# Altium footprint library OT Library.PcbLib: 396 footprints (part 14 of 25)
Each footprint in its own frame and in the unit in brackets; x right, y up, seen from the top. Pads: shape width x height; smd on the part's side, far side on the other; paste and mask are expansions set on the pad; w line width, h text height; cw(c..) or ccw(c..) is an arc to the next point about the centre after c.
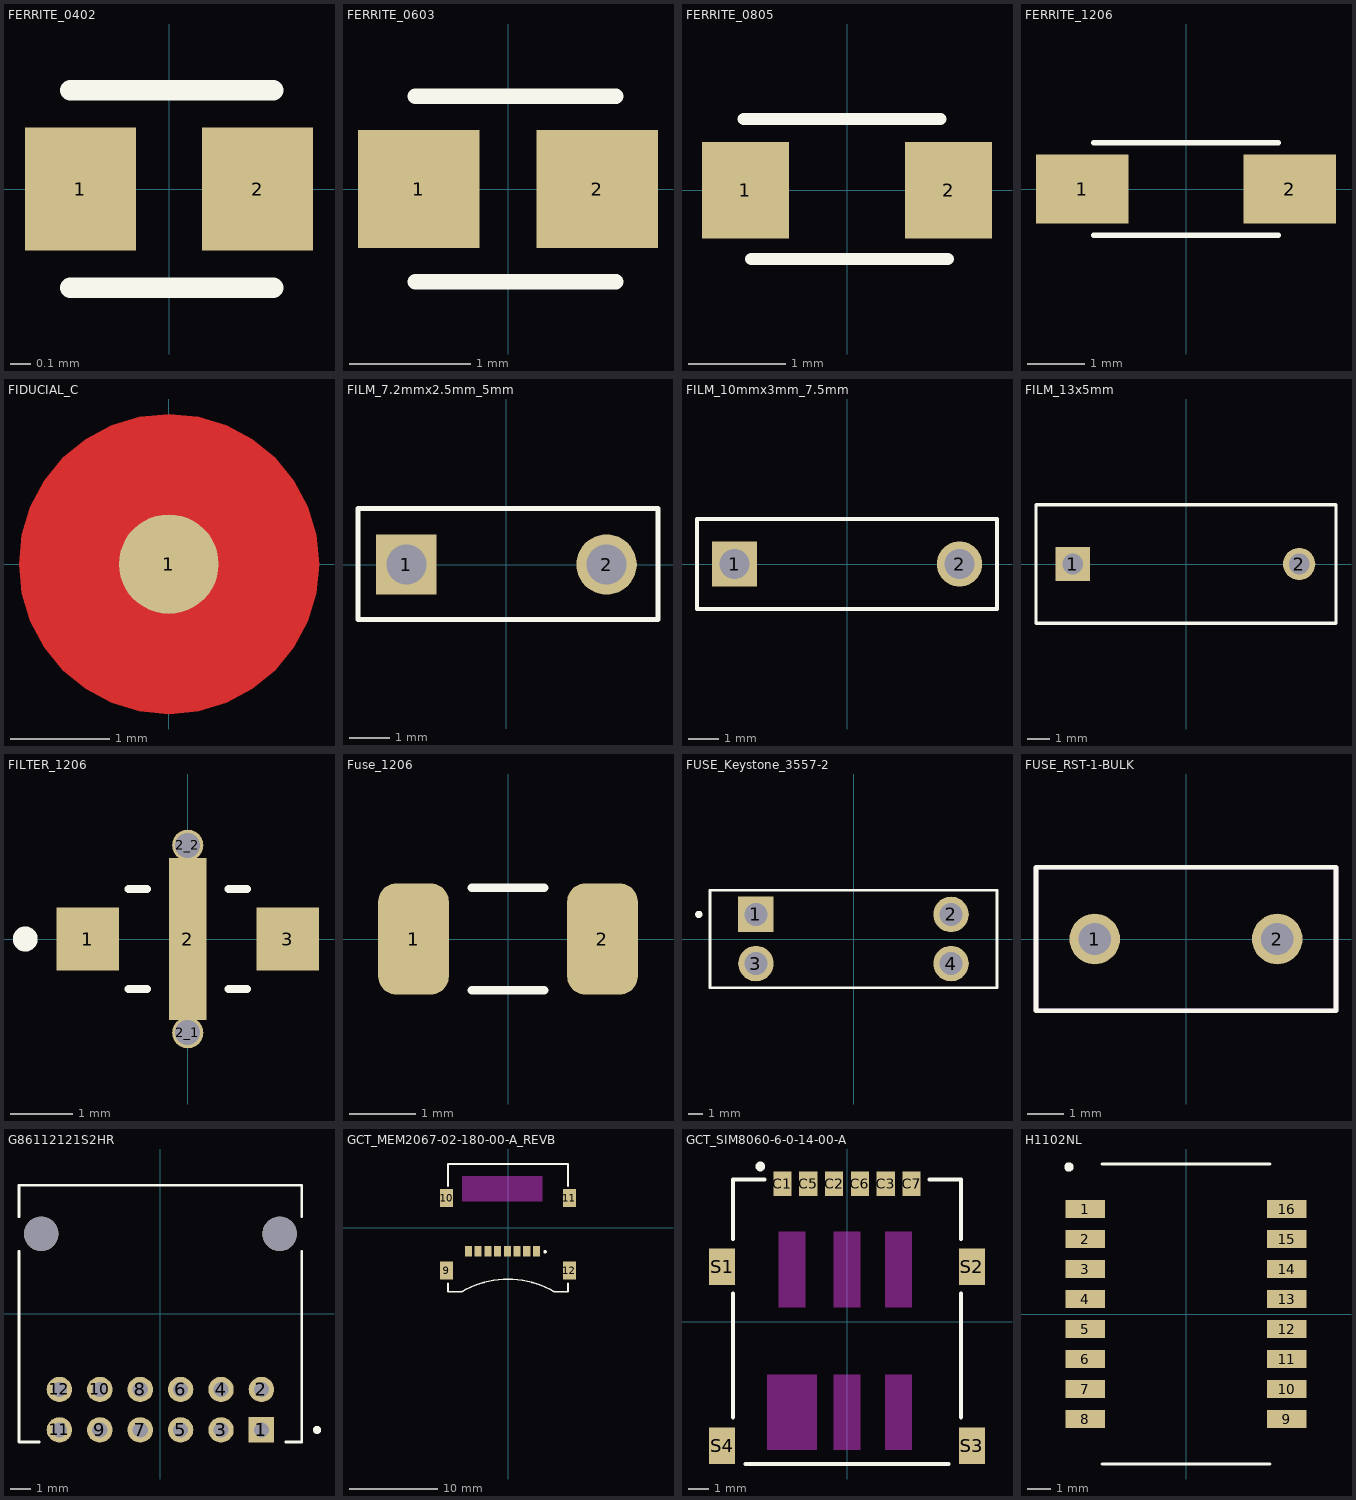
[diagram p13: the footprints below, top view; thin cyan lines are the x and y axes]

## FERRITE_0402 [mm] "0.039\" L x 0.022\" W (1.00mm x 0.55mm)"
height 0.55
pads (2):
  rect 0.54x0.6 smd: 1(-0.432,0) 2(0.432,0)
Top Overlay:
  lines w0.1: -0.483,-0.483 0.508,-0.483 ; -0.483,0.483 0.508,0.483
3D body: height 0.48, standoff -0.02, extent -0.5,-0.279 0.5,0.271

## FERRITE_0603 [mm] "0.063\" L x 0.032\" W (1.60mm x 0.80mm)"
height 0.95
pads (2):
  rect 1x0.97 smd: 1(-0.735,0) 2(0.735,0)
Top Overlay:
  lines w0.127: -0.762,-0.762 0.889,-0.762 ; -0.762,0.762 0.889,0.762
3D body: height 0.8, standoff 0, extent -0.8,-0.48 0.8,0.47

## FERRITE_0805 [mm] "SMD EMI Suppression Ferrite Bead, 2-Leads, body 2.00x1.20mm"
height 1.1
pads (2):
  rect 0.9x1 smd: 1(-1.05,0) 2(1.05,0)
Top Overlay:
  lines w0.127: -1.067,0.737 0.965,0.737 ; -0.991,-0.711 1.041,-0.711
3D body: height 0.9, standoff 0, extent -1,-0.6 1,0.6

## FERRITE_1206 [mm] "SMD EMI Suppression Ferrite  Bead, body 3.20x1.60mm"
height 1.3
pads (2):
  rect 1.6x1.2 smd: 1(-1.8,0) 2(1.8,0)
Top Overlay:
  lines w0.1: -1.6,-0.8 1.6,-0.8 ; -1.6,0.8 1.6,0.8
3D body: height 1.1, standoff 0, extent -1.6,-0.8 1.6,0.8

## FIDUCIAL_C [mm]
pads (1):
  rrect100% 1x1 smd: 1(0,0)
Top Layer:
  pour cut-out: 0.002,-1.506 -0.292,-1.477 -0.574,-1.392 -0.835,-1.252 -1.063,-1.065 -1.251,-0.836 -1.39,-0.576 -1.476,-0.293 -1.505,0.001 -1.476,0.295 -1.39,0.578 -1.251,0.838 -1.063,1.067 -0.835,1.254 -0.574,1.394 -0.292,1.479 0.002,1.508 0.296,1.479 0.579,1.394 0.84,1.254 1.068,1.067 1.256,0.838 1.395,0.578 1.481,0.295 1.51,0.001 1.481,-0.293 1.395,-0.576 1.256,-0.836 1.068,-1.065 0.84,-1.252 0.579,-1.392 0.296,-1.477
Top Solder:
  circle w1.5: c0,0 r0.75

## FILM_7.2mmx2.5mm_5mm [mm]
height 8
pads (2):
  rect 1.508x1.508 / inner round 1.508 / far side rect 1.508x1.508 hole 1: 1(-2.5,0)
  round 1.508 hole 1: 2(2.5,0)
Top Overlay:
  lines w0.127: -3.707,-1.372 3.785,-1.372 3.785,1.397 -3.707,1.397 -3.707,-1.372
3D body: height 6.6, standoff -5.5, extent -3.7,-1.295 3.7,1.31

## FILM_10mmx3mm_7.5mm [mm]
height 8
pads (2):
  rect 1.508x1.508 / inner round 1.508 / far side rect 1.508x1.508 hole 1: 1(-3.75,0)
  round 1.508 hole 1: 2(3.75,0)
Top Overlay:
  lines w0.127: -5,-1.5 -5,1.5 5,1.5 5,-1.5 -5,-1.5
3D body: height 8.1, standoff -6, extent -5.1,-1.524 5.1,1.581

## FILM_13x5mm [mil] "Height 0.437\" (11.10mm)"
height 158
pads (2):
  rect 60x60 hole 36 mask-1000: 1(-196.85,0)
  round 56 hole 36 mask-1000: 2(196.85,0)
Top Overlay:
  lines w6: -260.9,-103.42 -260.9,103.42 260.9,103.42 260.9,-103.42 -260.9,-103.42
Top Solder:
  region: 196.85,-28.24 204.16,-27.28 210.97,-24.46 216.82,-19.97 221.31,-14.12 224.13,-7.31 225.09,0 224.13,7.31 221.31,14.12 216.82,19.97 210.97,24.46 204.16,27.28 196.85,28.24 189.54,27.28 182.73,24.46 176.88,19.97 172.39,14.12 169.57,7.31 168.61,0 169.57,-7.31 172.39,-14.12 176.88,-19.97 182.73,-24.46 189.54,-27.28
  region: -226.85,-30 -166.85,-30 -166.85,30 -226.85,30
Bottom Solder:
  region: 196.85,-28.24 204.16,-27.28 210.97,-24.46 216.82,-19.97 221.31,-14.12 224.13,-7.31 225.09,0 224.13,7.31 221.31,14.12 216.82,19.97 210.97,24.46 204.16,27.28 196.85,28.24 189.54,27.28 182.73,24.46 176.88,19.97 172.39,14.12 169.57,7.31 168.61,0 169.57,-7.31 172.39,-14.12 176.88,-19.97 182.73,-24.46 189.54,-27.28
  region: -226.85,-30 -166.85,-30 -166.85,30 -226.85,30
3D body: height 353.07, standoff -180, extent -255.9,-98.42 255.91,98.43

## FILTER_1206 [mm] "1206 (3216 Metric), 3 PC Pad"
height 1.75
pads (5):
  rect 1x1 smd mask+0: 1(-1.6,0) 3(1.6,0)
  rect 0.6x2.6 smd paste-2 mask+0: 2(0,0)
  round 0.5 hole 0.4 mask+0: 2_1(0,-1.5) 2_2(0,1.5)
Top Overlay:
  circle w0.2: c-2.6,0 r0.1
  lines w0.127: -0.95,-0.8 -0.65,-0.8 ; -0.95,0.8 -0.65,0.8 ; 0.65,-0.8 0.95,-0.8 ; 0.65,0.8 0.95,0.8
Top Paste:
  region: 0.3,0.3 -0.3,0.3 -0.3,1.3 0.3,1.3
  region: 0.3,-1.3 -0.3,-1.3 -0.3,-0.3 0.3,-0.3
Top Solder:
  region: -1.1,-0.5 -2.1,-0.5 -2.1,0.5 -1.1,0.5
  region: 2.1,-0.5 1.1,-0.5 1.1,0.5 2.1,0.5
  region: 0.3,-1.3 -0.3,-1.3 -0.3,1.3 0.3,1.3
3D body: height 1.68, standoff 0.07, extent -1.6,-0.861 1.6,0.889

## Fuse_1206 [mm]
pads (2):
  rrect50% 1.07x1.68 smd: 1(-1.43,0) 2(1.43,0)
Top Overlay:
  lines w0.127: -0.55,-0.775 0.55,-0.775 ; -0.55,0.775 0.55,0.775
3D body: height 0.75, standoff 0, extent -1.6,-0.8 1.6,0.8

## FUSE_Keystone_3557-2 [mm]
pads (4):
  rect 2.45x2.45 hole 1.6 paste-1000 mask+0: 1(-6.735,1.7)
  round 2.45 hole 1.6 paste-1000 mask+0: 2(6.735,1.7) 3(-6.735,-1.7) 4(6.735,-1.7)
Top Overlay:
  circle w0.25: c-10.68,1.7 r0.125
  lines w0.2: -9.905,-3.365 9.905,-3.365 9.905,3.365 -9.905,3.365 -9.905,-3.365
3D body: height 0.25, standoff 0, extent -10.08,-3.54 10.08,3.54

## FUSE_RST-1-BULK [mm]
pads (2):
  round 1.408 hole 0.9: 1(-2.54,0) 2(2.54,0)
Top Overlay:
  lines w0.127: -4.175,-2 -4.175,2 4.175,2 4.175,-2 -4.175,-2
3D Top:
  lines w0.127: -4.175,-2 4.175,-2 4.175,2 -4.175,2 -4.175,-2
3D body: height 7.2, standoff -4.3, extent -4.24,-2.065 4.11,1.935

## G86112121S2HR [mm]
height 8.5
pads (14):
  rect 1.258x1.258 hole 0.75: 1(5,-5.75)
  round 1.258 hole 0.75: 2(5,-3.75) 3(3,-5.75) 4(3,-3.75) 5(1,-5.75) 6(1,-3.75) 7(-1,-5.75) 8(-1,-3.75) 9(-3,-5.75) 10(-3,-3.75) 11(-5,-5.75) 12(-5,-3.75)
  round 1.7 hole 1.7 unplated: ""(-5.9,3.95) ""(5.9,3.95)
Top Overlay:
  circle w0.2: c7.75,-5.75 r0.1
  lines w0.127: -7,3.1 -7,-6.35 -6,-6.35 ; -7,4.8 -7,6.35 7,6.35 7,4.8 ; 6.2,-6.35 7,-6.35 7,3.1
3D body: height 8.5, standoff -1.8, extent -7,-6.4 7,6.3

## GCT_MEM2067-02-180-00-A_REVB [mm]
pads (12):
  rect 0.8x1.2 smd: 1(3.225,-2.625) 2(2.125,-2.625) 3(1.025,-2.625) 4(-0.075,-2.625) 5(-1.175,-2.625) 6(-2.275,-2.625) 7(-3.375,-2.625) 8(-4.475,-2.625)
  rect 1.5x2 smd: 9(-6.945,-4.825) 10(-6.945,3.375) 11(6.945,3.375) 12(6.945,-4.825)
Top Overlay:
  circle w0.2: c4.2,-2.7 r0.1
  lines w0.2: -6.8,-6.275 -6.8,-7.225 -5.25,-7.225 ; -6.8,4.725 -6.8,7.225 6.8,7.225 6.8,4.725 ; -5.226,-7.211 cw(c0,-16.264) 5.226,-7.211 ; 5.25,-7.225 6.8,-7.225 6.8,-6.275
Keep-Out Layer:
  region: 3.85,3.028 -5.155,3.028 -5.155,5.825 3.85,5.825
3D body: height 1.8, standoff 0, extent -7.3,-7.225 7.3,7.225

## GCT_SIM8060-6-0-14-00-A [mm]
pads (10):
  rect 0.9x1.2 smd: C1(-3.175,6.8) C2(-0.635,6.8) C3(1.905,6.8) C5(-1.905,6.8) C6(0.635,6.8) C7(3.175,6.8)
  rect 1.3x1.8 smd: S1(-6.15,2.7) S2(6.15,2.7) S3(6.15,-6.1) S4(-6.15,-6.1)
Top Overlay:
  circle w0.24: c-4.267,7.645 r0.12
  lines w0.2: -5.6,-4.699 -5.6,1.397 ; -5.6,4.064 -5.6,7 -4.064,7 ; -5,-7 5,-7 ; 4.064,7 5.6,7 5.6,4.064 ; 5.6,-4.699 5.6,1.397
Keep-Out Layer:
  region: -2.06,0.72 -3.36,0.72 -3.36,4.42 -2.06,4.42
  region: 0.65,0.72 -0.65,0.72 -0.65,4.42 0.65,4.42
  region: 3.19,0.72 1.89,0.72 1.89,4.42 3.19,4.42
  region: -1.49,-6.3 -3.93,-6.3 -3.93,-2.6 -1.49,-2.6
  region: 0.65,-6.3 -0.65,-6.3 -0.65,-2.6 0.65,-2.6
  region: 3.19,-6.3 1.89,-6.3 1.89,-2.6 3.19,-2.6
  region: -2.06,0.72 -3.36,0.72 -3.36,4.42 -2.06,4.42
  region: 0.65,0.72 -0.65,0.72 -0.65,4.42 0.65,4.42
  region: 3.19,0.72 1.89,0.72 1.89,4.42 3.19,4.42
  region: -1.49,-6.3 -3.93,-6.3 -3.93,-2.6 -1.49,-2.6
  region: 0.65,-6.3 -0.65,-6.3 -0.65,-2.6 0.65,-2.6
  region: 3.19,-6.3 1.89,-6.3 1.89,-2.6 3.19,-2.6
3D body: height 1.4, standoff -0.03, extent -6.2,-7.1 6.2,7

## H1102NL [mm]
pads (16):
  rect 1.67x0.76 smd: 1(-4.265,4.445) 2(-4.265,3.175) 3(-4.265,1.905) 4(-4.265,0.635) 5(-4.265,-0.635) 6(-4.265,-1.905) 7(-4.265,-3.175) 8(-4.265,-4.445) 9(4.265,-4.445) 10(4.265,-3.175) 11(4.265,-1.905) 12(4.265,-0.635) 13(4.265,0.635) 14(4.265,1.905) 15(4.265,3.175) 16(4.265,4.445)
Top Overlay:
  circle w0.2: c-4.953,6.223 r0.1
  lines w0.127: -3.555,-6.35 3.555,-6.35 ; -3.555,6.35 3.555,6.35
3D body: height 5.97, standoff 0, extent -4.699,-6.35 4.699,6.35